# Altium footprint library BASIC.PcbLib: 244 footprints (part 8 of 16)
Each footprint in its own frame and in the unit in brackets; x right, y up, seen from the top. Pads: shape width x height; smd on the part's side, far side on the other; paste and mask are expansions set on the pad; w line width, h text height; cw(c..) or ccw(c..) is an arc to the next point about the centre after c.
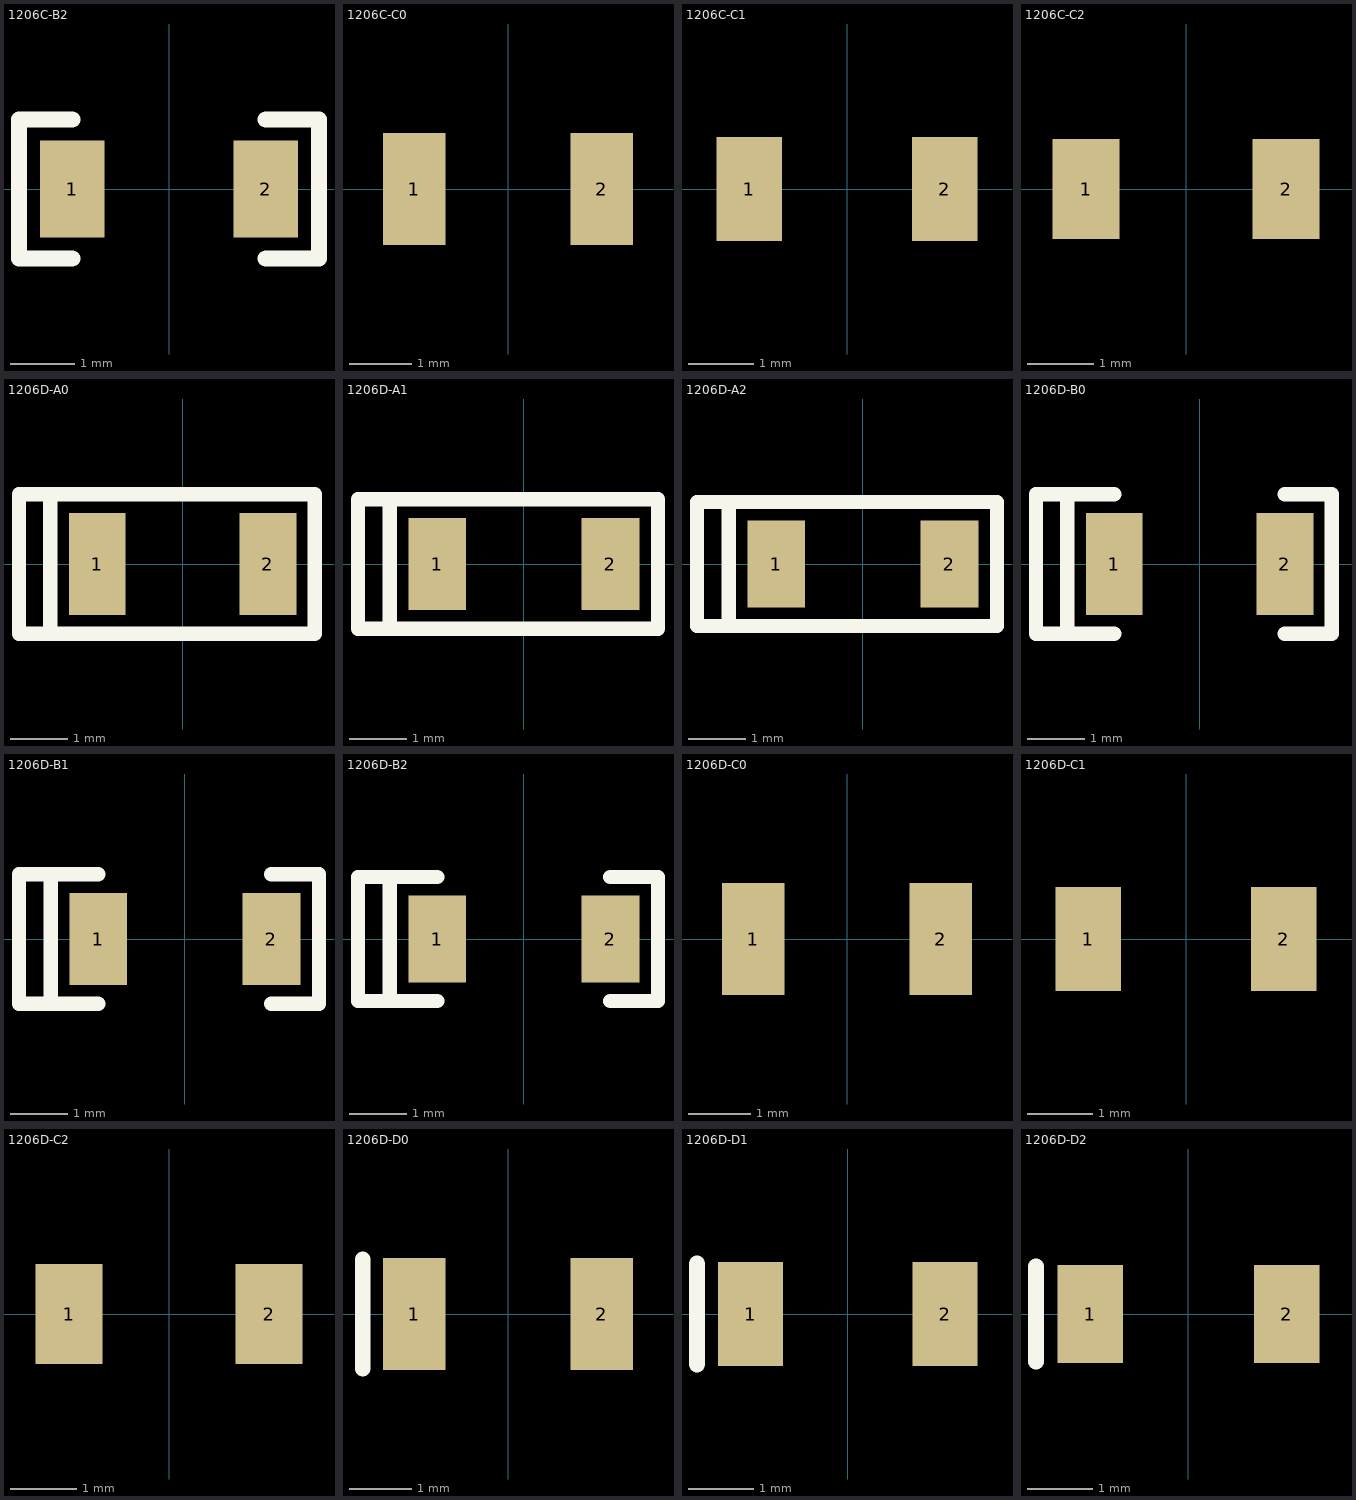
[diagram p7: the footprints below, top view; thin cyan lines are the x and y axes]

## 1206C-B2 [mm]
pads (2):
  rect 1x1.5 smd: 1(-1.5,0) 2(1.5,0)
Top Overlay:
  lines w0.25: -1.5,-1.075 -2.325,-1.075 -2.325,1.075 -1.5,1.075 ; 1.5,-1.075 2.325,-1.075 2.325,1.075 1.5,1.075
3D body "1206R.stp": height 0.6, standoff 0, extent -1.6,-0.8 1.6,0.8

## 1206C-C0 [mm]
pads (2):
  rect 1x1.8 smd: 1(-1.5,0) 2(1.5,0)
3D body "1206R.stp": height 0.6, standoff 0, extent -1.6,-0.8 1.6,0.8

## 1206C-C1 [mm]
pads (2):
  rect 1x1.6 smd: 1(-1.5,0) 2(1.5,0)
3D body "1206R.stp": height 0.6, standoff 0, extent -1.6,-0.8 1.6,0.8

## 1206C-C2 [mm]
pads (2):
  rect 1x1.5 smd: 1(-1.5,0) 2(1.5,0)
3D body "1206R.stp": height 0.6, standoff 0, extent -1.6,-0.8 1.6,0.8

## 1206D-A0 [mm]
pads (2):
  rect 1x1.8 smd: 1(-1.5,0) 2(1.5,0)
Top Overlay:
  lines w0.25: -2.325,-1.225 2.325,-1.225 2.325,1.225 -2.325,1.225 ; -2.325,-1.225 -2.875,-1.225 -2.875,1.225 -2.325,1.225 ; -2.325,-1.225 -2.325,1.225
3D body "User Library-D1206.STEP": height 0.85, standoff 0, extent -1.672,-0.863 1.678,0.866

## 1206D-A1 [mm]
pads (2):
  rect 1x1.6 smd: 1(-1.5,0) 2(1.5,0)
Top Overlay:
  lines w0.25: -2.325,-1.125 -2.875,-1.125 -2.875,1.125 -2.325,1.125 ; -2.325,-1.125 2.325,-1.125 2.325,1.125 -2.325,1.125 ; -2.325,-1.125 -2.325,1.125
3D body "User Library-D1206.STEP": height 0.85, standoff 0, extent -1.672,-0.863 1.678,0.866

## 1206D-A2 [mm]
pads (2):
  rect 1x1.5 smd: 1(-1.5,0) 2(1.5,0)
Top Overlay:
  lines w0.25: -2.325,-1.075 -2.875,-1.075 -2.875,1.075 -2.325,1.075 ; -2.325,-1.075 -2.325,1.075 ; -2.325,-1.075 2.325,-1.075 2.325,1.075 -2.325,1.075
3D body "User Library-D1206.STEP": height 0.85, standoff 0, extent -1.672,-0.863 1.678,0.866

## 1206D-B0 [mm]
pads (2):
  rect 1x1.8 smd: 1(-1.5,0) 2(1.5,0)
Top Overlay:
  lines w0.25: -1.5,-1.225 -2.325,-1.225 ; -1.5,1.225 -2.325,1.225 ; 1.5,-1.225 2.325,-1.225 2.325,1.225 1.5,1.225 ; -2.325,-1.225 -2.875,-1.225 -2.875,1.225 -2.325,1.225 ; -2.325,-1.225 -2.325,1.225
3D body "User Library-D1206.STEP": height 0.85, standoff 0, extent -1.672,-0.863 1.678,0.866

## 1206D-B1 [mm]
pads (2):
  rect 1x1.6 smd: 1(-1.5,0) 2(1.5,0)
Top Overlay:
  lines w0.25: -1.5,-1.125 -2.325,-1.125 ; -1.5,1.125 -2.325,1.125 ; 1.5,-1.125 2.325,-1.125 2.325,1.125 1.5,1.125 ; -2.325,-1.125 -2.875,-1.125 -2.875,1.125 -2.325,1.125 ; -2.325,-1.125 -2.325,1.125
3D body "User Library-D1206.STEP": height 0.85, standoff 0, extent -1.672,-0.863 1.678,0.866

## 1206D-B2 [mm]
pads (2):
  rect 1x1.5 smd: 1(-1.5,0) 2(1.5,0)
Top Overlay:
  lines w0.25: -1.5,-1.075 -2.325,-1.075 ; -1.5,1.075 -2.325,1.075 ; 1.5,-1.075 2.325,-1.075 2.325,1.075 1.5,1.075 ; -2.325,-1.075 -2.325,1.075 ; -2.325,-1.075 -2.875,-1.075 -2.875,1.075 -2.325,1.075
3D body "User Library-D1206.STEP": height 0.85, standoff 0, extent -1.672,-0.863 1.678,0.866

## 1206D-C0 [mm]
pads (2):
  rect 1x1.8 smd: 1(-1.5,0) 2(1.5,0)
3D body "User Library-D1206.STEP": height 0.85, standoff 0, extent -1.672,-0.863 1.678,0.866

## 1206D-C1 [mm]
pads (2):
  rect 1x1.6 smd: 1(-1.5,0) 2(1.5,0)
3D body "User Library-D1206.STEP": height 0.85, standoff 0, extent -1.672,-0.863 1.678,0.866

## 1206D-C2 [mm]
pads (2):
  rect 1x1.5 smd: 1(-1.5,0) 2(1.5,0)
3D body "User Library-D1206.STEP": height 0.85, standoff 0, extent -1.672,-0.863 1.678,0.866

## 1206D-D0 [mm]
pads (2):
  rect 1x1.8 smd: 1(-1.5,0) 2(1.5,0)
Top Overlay:
  lines w0.25: -2.325,-0.875 -2.325,0.875
3D body "User Library-D1206.STEP": height 0.85, standoff 0, extent -1.672,-0.863 1.678,0.866

## 1206D-D1 [mm]
pads (2):
  rect 1x1.6 smd: 1(-1.5,0) 2(1.5,0)
Top Overlay:
  lines w0.25: -2.325,-0.775 -2.325,0.775
3D body "User Library-D1206.STEP": height 0.85, standoff 0, extent -1.672,-0.863 1.678,0.866

## 1206D-D2 [mm]
pads (2):
  rect 1x1.5 smd: 1(-1.5,0) 2(1.5,0)
Top Overlay:
  lines w0.25: -2.325,-0.725 -2.325,0.725
3D body "User Library-D1206.STEP": height 0.85, standoff 0, extent -1.672,-0.863 1.678,0.866